# Altium schematic symbol library IC.SchLib: 555 symbols (part 2 of 15)
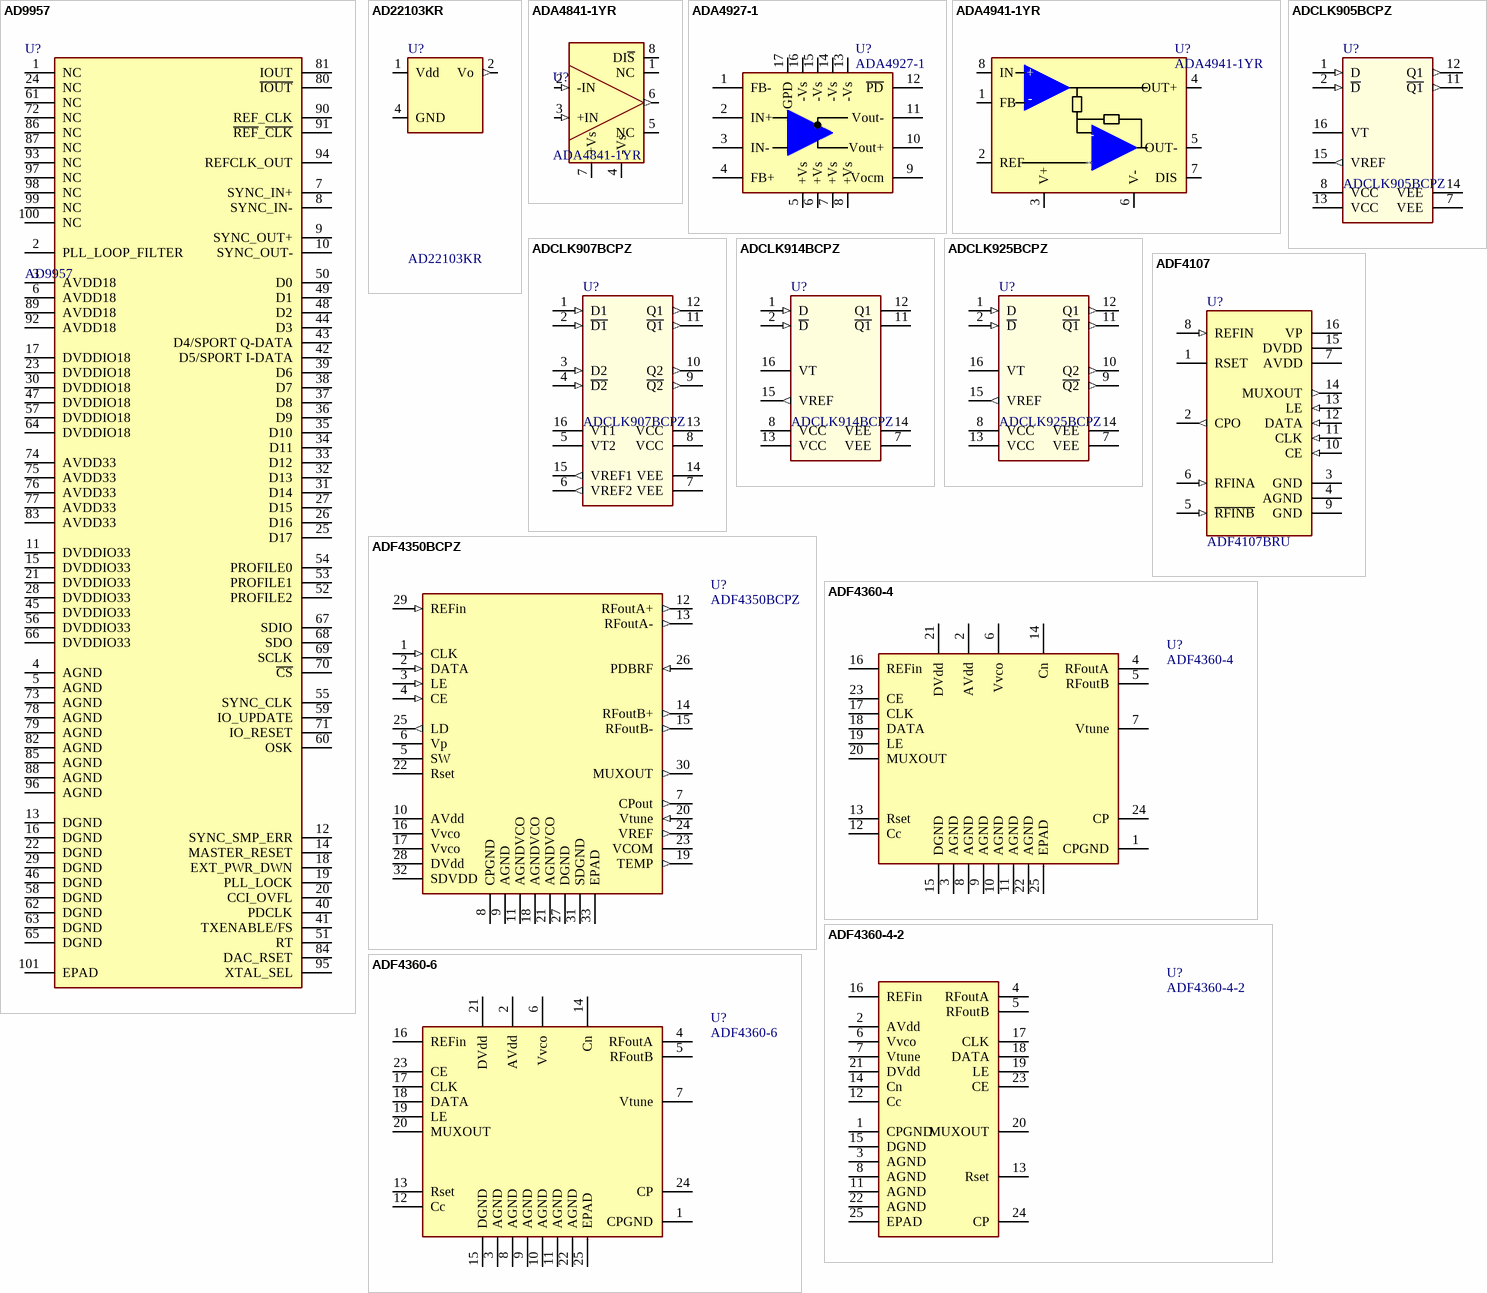
[diagram p71: symbols AD9957 to ADF4360-6]

## ADF4360-4
designator U?
Integrated Synthesizer and VCO; Manufacturer: Analog Devices; Manufacturer No: ADF4360-4BCPZ; Sort: 510; Tech: SMDR; Package: LFCSP24; Price: 0
footprint LFCSP24_EP (QFN, 24-Leads, Body 4,0x4,0mm (max), Pitch 0,50mm, IPC Medium Density)
pins: 1 CPGND, 2 AVdd, 3 AGND, 4 RFoutA, 5 RFoutB, 6 Vvco, 7 Vtune, 8 AGND, 9 AGND, 10 AGND, 11 AGND, 12 Cc, 13 Rset, 14 Cn, 15 DGND, 16 REFin, 17 CLK, 18 DATA, 19 LE, 20 MUXOUT, 21 DVdd, 22 AGND, 23 CE, 24 CP, 25 EPAD

## ADF4360-4-2
designator U?
Integrated Synthesizer and VCO; Manufacturer: Analog Devices; Manufacturer No: ADF4360-4BCPZ; Sort: 510; Tech: SMDR; Package: LFCSP24; Price: 0
footprint LFCSP24_EP (QFN, 24-Leads, Body 4,0x4,0mm (max), Pitch 0,50mm, IPC Medium Density)
pins: 1 CPGND, 2 AVdd, 3 AGND, 4 RFoutA, 5 RFoutB, 6 Vvco, 7 Vtune, 8 AGND, 11 AGND, 12 Cc, 13 Rset, 14 Cn, 15 DGND, 16 REFin, 17 CLK, 18 DATA, 19 LE, 20 MUXOUT, 21 DVdd, 22 AGND, 23 CE, 24 CP, 25 EPAD

## ADF4360-6
designator U?
Integrated Synthesizer and VCO; Manufacturer: Analog Devices; Manufacturer No: ADF4360-6BCPZ; Sort: 510; Tech: SMDR; Package: LFCSP24; Price: 0
footprint LFCSP24_EP (QFN, 24-Leads, Body 4,0x4,0mm (max), Pitch 0,50mm, IPC Medium Density)
pins: 1 CPGND, 2 AVdd, 3 AGND, 4 RFoutA, 5 RFoutB, 6 Vvco, 7 Vtune, 8 AGND, 9 AGND, 10 AGND, 11 AGND, 12 Cc, 13 Rset, 14 Cn, 15 DGND, 16 REFin, 17 CLK, 18 DATA, 19 LE, 20 MUXOUT, 21 DVdd, 22 AGND, 23 CE, 24 CP, 25 EPAD

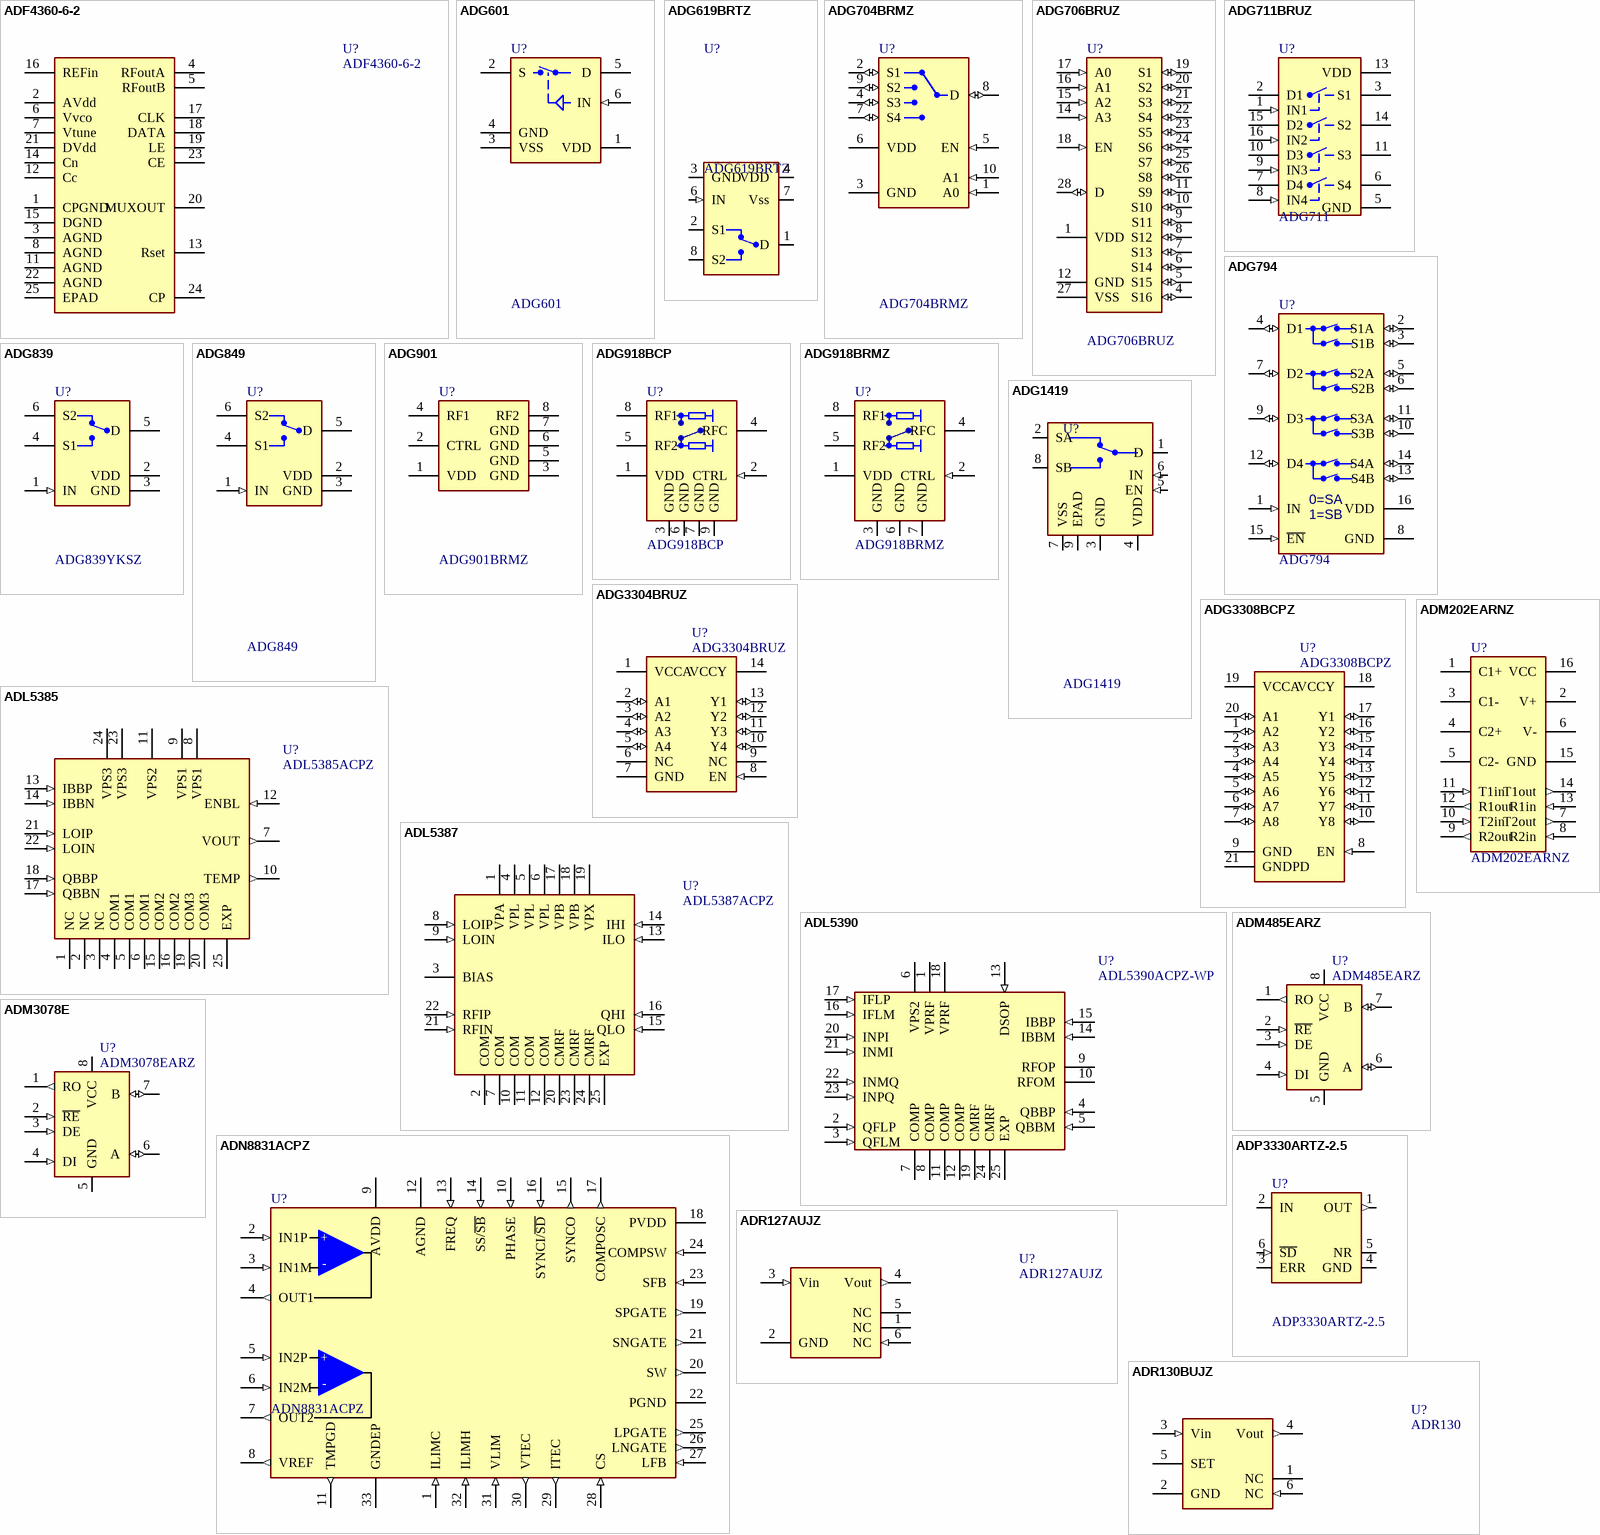
[diagram p6: symbols ADF4360-6-2 to ADR130BUJZ]

## ADF4360-6-2
designator U?
Integrated Synthesizer and VCO; Manufacturer: Analog Devices; Manufacturer No: ADF4360-6BCPZ; Sort: 510; Tech: SMDR; Package: LFCSP24; Price: 0
footprint LFCSP24_EP (QFN, 24-Leads, Body 4,0x4,0mm (max), Pitch 0,50mm, IPC Medium Density)
pins: 1 CPGND, 2 AVdd, 3 AGND, 4 RFoutA, 5 RFoutB, 6 Vvco, 7 Vtune, 8 AGND, 11 AGND, 12 Cc, 13 Rset, 14 Cn, 15 DGND, 16 REFin, 17 CLK, 18 DATA, 19 LE, 20 MUXOUT, 21 DVdd, 22 AGND, 23 CE, 24 CP, 25 EPAD

## ADG601
designator U?
2Ohm SPST Switch; Manufacturer: Analog Devices, Farnell; Manufacturer No: ADG601BRTZ-REEL7, 1661035; Comment2: +-5V/+5V; Sort: 510; Tech: SMDR; Package: SOT-23; Price: 0
footprint SOT23-6
pins: 1 VDD (power), 2 S, 3 VSS (power), 4 GND (power), 5 D, 6 IN (in)

## ADG619BRTZ
designator U?
4R, Single SPDT Switches; Manufacturer: Analog Devices; Comment2: ±2.7..±5.5Vcc 4Rsw (SCC); Sort: 510; Tech: SMDR; Manufacturer No: ADG619BRTZ; Package: SOIC8; Price: 0
signal-integrity model Model Name (Model Description)
footprint SOT23-8
pins: 1 D, 2 S1, 3 GND (power), 4 VDD (power), 6 IN (in), 7 Vss (power), 8 S2

## ADG704BRMZ
designator U?
Low Voltage 4:1 Mux Analog; Manufacturer: Analog Devices, Farnell; Manufacturer No: ADG704BRMZ, 9425756; Comment2: 1.8..5.5Vcc 2.5Ron; Sort: 510; Tech: SMDR; Package: MSOP10; Price: 2.5
footprint MSOP10-1 (MSOP 10pin 3x3mm R0.5mm)
pins: 1 A0 (in), 2 S1 (io), 3 GND (power), 4 S3 (io), 5 EN (in), 6 VDD (power), 7 S4 (io), 8 D (io), 9 S2 (io), 10 A1 (in)

## ADG706BRUZ
designator U?
16-channel analog multiplexer; Manufacturer: Analog, Farnell; Manufacturer No: ADG706BRUZ, 9604332; Comment2: 1.8..5.5Vcc 2.5Ronmax; Sort: 510; Tech: SMDR; Package: TSSOP28; Price: 5.4
footprint TSSOP28 (TSSOP, 28-Leads, Body 9,8x4,5mm (max), Pitch 0,65mm, IPC Medium Density)
pins: 1 VDD (power), 4 S16 (io), 5 S15 (io), 6 S14 (io), 7 S13 (io), 8 S12 (io), 9 S11 (io), 10 S10 (io), 11 S9 (io), 12 GND (power), 14 A3 (in), 15 A2 (in), 16 A1 (in), 17 A0 (in), 18 EN (in), 19 S1 (io), 20 S2 (io), 21 S3 (io), 22 S4 (io), 23 S5 (io), 24 S6 (io), 25 S7 (io), 26 S8 (io), 27 VSS (power), 28 D (io)

## ADG711BRUZ
designator U?, comment ADG711
Low Voltage 4 Quad SPST Switches; Manufacturer: Analog Devices; Manufacturer No: ADG711BRUZ; Comment2: 1.8 V to 5.5 V; 2.5 Ohm; Sort: 510; Tech: SMDR; Package: TSSOP-16; Price: 0
signal-integrity model Model Name (Model Description)
footprint TSSOP16 (TSSOP16 5x4.4mm R0.65mm)
pins: 1 IN1 (in), 2 D1, 3 S1, 5 GND (power), 6 S4, 7 D4, 8 IN4 (in), 9 IN3 (in), 10 D3, 11 S3, 13 VDD (power), 14 S2, 15 D2, 16 IN2 (in)

## ADG794
designator U?
Low Voltage, 300 MHz Quad 2:1 Mux Analog HDTV Audio/Video switch; Manufacturer: Analog Devices; Manufacturer No: ADG794BRQZ; Comment2: 3.3V;; Sort: 510; Tech: SMDR; Package: TSSOP16; Price: 0
footprint TSSOP16 (TSSOP16 5x4.4mm R0.65mm)
pins: 1 IN (in), 2 S1A (io), 3 S1B (io), 4 D1 (io), 5 S2A (io), 6 S2B (io), 7 D2 (io), 8 GND (power), 9 D3 (io), 10 S3B (io), 11 S3A (io), 12 D4 (io), 13 S4B (io), 14 S4A (io), 15 ~{EN} (in), 16 VDD (power)
text: 0=SA; 1=SB

## ADG839
designator U?, comment ADG839YKSZ
CMOS Single SPDT Switch/2:1 MUX; Manufacturer: Analog Devices; Comment2: 1.65 V to 3.6 V; 0.35R; Sort: 510; Tech: SMDR; Manufacturer No: ADG839YKSZ; Package: SC70-6; Price: 0
signal-integrity model Model Name (Model Description)
footprint SC70-6 (6-Leads, Body 2,0x2,1mm (max), Pitch 0,65mm, IPC Medium Density)
pins: 1 IN (in), 2 VDD (power), 3 GND (power), 4 S1, 5 D, 6 S2

## ADG849
designator U?
0.5Ohm SPDT/2:1 Mux; Manufacturer: Analog Devices; Manufacturer No: ADG849YKSZ-500RL7; Sort: 510; Tech: SMDR; Package: SC70-6; Price: 0
footprint SC70-6 (6-Leads, Body 2,0x2,1mm (max), Pitch 0,65mm, IPC Medium Density)
pins: 1 IN (in), 2 VDD (power), 3 GND (power), 4 S1, 5 D, 6 S2

## ADG901
designator U?, comment ADG901BRMZ
CMOS Wideband, 40dB isolation at 1GHz 1.65V to 2.75, SPST switch; Manufacturer: Analog Devices; Comment2: 1.65 V to 2.75 V; 50R; Sort: 510; Tech: SMDR; Manufacturer No: ADG901BRMZ; Package: TSSOP8; Price: 0
signal-integrity model Model Name (Model Description)
footprint TSSOP8 (TSSOP8 3x3mm R0.65mm)
pins: 1 VDD, 2 CTRL, 3 GND, 4 RF1, 5 GND, 6 GND, 7 GND, 8 RF2

## ADG918BCP
designator U?
SPDT High Power CMOS RF Switch 4GHz; Manufacturer: Analog Devices; Comment2: 1.65-2.75Vcc, 1uA; Sort: 510; Tech: SMDR; Manufacturer No: ADG918BCP; Package: LFCSP8; Price: 0
footprint LFCSP8-1
pins: 1 VDD (power), 2 CTRL (in), 3 GND (power), 4 RFC (hiz), 5 RF2 (hiz), 6 GND (power), 7 GND (power), 8 RF1 (hiz), 9 GND (power)

## ADG918BRMZ
designator U?
SPDT High Power CMOS RF Switch; SO8; Manufacturer: Analog Devices; Sort: 510; Tech: SMDR; Manufacturer No: ADG918BRMZ; Package: MSOP08; Price: 0
footprint TSSOP8 (TSSOP8 3x3mm R0.65mm)
pins: 1 VDD (power), 2 CTRL (in), 3 GND (power), 4 RFC (hiz), 5 RF2 (hiz), 6 GND (power), 7 GND (power), 8 RF1 (hiz)

## ADG1419
designator U?
2.1R On Resistance, ±15 V/+12 V/±5 V  iCMOS SPDT Switch; Manufacturer: Analog Devices, Digi-Key; Manufacturer No: ADG1419BCPZ-REEL7, ADG1419BCPZ-REEL7CT-ND; Sort: 510; Tech: SMDR; Package: LFCSP8; Price: 0
footprint LFCSP8-2 (QFN, 8-Leads, Body 3,0x2,0mm (max), Pitch 0,50mm, IPC Medium Density)
pins: 1 D, 2 SA, 3 GND (power), 4 VDD (power), 5 EN (in), 6 IN (in), 7 VSS (power), 8 SB, 9 EPAD (power)
1 alternate drawing of the same symbol

## ADG3304BRUZ
designator U?
Low Voltage, 1.15 V to 5.5 V, 4-Channel,  Bidirectional Logic Level Translator; Manufacturer: Analog Devices, Farnell; Manufacturer No: ADG3304BRUZ, 1078228; Comment2: 1.15-5.5V; Sort: 510; Tech: SMDR; Package: TSSOP14; Price: 3.2
footprint TSSOP14 (TSSOP14 5x4.4mm R0.65mm)
pins: 1 VCCA (power), 2 A1 (io), 3 A2 (io), 4 A3 (io), 5 A4 (io), 6 NC, 7 GND (power), 8 EN (in), 9 NC, 10 Y4 (io), 11 Y3 (io), 12 Y2 (io), 13 Y1 (io), 14 VCCY (power)

## ADG3308BCPZ
designator U?
Low Voltage, 1.15 V to 5.5 V, 8-Channel,  Bidirectional Logic Level Translator; Manufacturer: Analog Devices, Digi-Key; Manufacturer No: ADG3308BCPZ, ADG3308BCPZ-REEL7; Comment2: 1.15-5.5V; Sort: 510; Tech: SMDR; Package: TSSOP14; Price: 3.2
footprint QFN50P400X400X100-20N (QFN, 20-Leads, Body 4,0x4,0mm (max), Pitch 0,50mm, IPC Medium Density)
pins: 1 A2 (io), 2 A3 (io), 3 A4 (io), 4 A5 (io), 5 A6 (io), 6 A7 (io), 7 A8 (io), 8 EN (in), 9 GND (power), 10 Y8 (io), 11 Y7 (io), 12 Y6 (io), 13 Y5 (io), 14 Y4 (io), 15 Y3 (io), 16 Y2 (io), 17 Y1 (io), 18 VCCY (power), 19 VCCA (power), 20 A1 (io), 21 GNDPD

## ADL5385
designator U?, comment ADL5385ACPZ
Quadrature modulator 50 TO 2200MHz; Manufacturer: Analog Devices; Sort: 510; Tech: SMDR; Manufacturer No: ADL5385ACPZ; Package: CP-24-2; Price: 0
footprint CP-24-2 (24pin LFCSP_VQ Waffle pack)
pins: 1 NC, 2 NC, 3 NC, 4 COM1 (power), 5 COM1 (power), 6 COM1 (power), 7 VOUT (out), 8 VPS1 (power), 9 VPS1 (power), 10 TEMP (out), 11 VPS2 (power), 12 ENBL (in), 13 IBBP (in), 14 IBBN (in), 15 COM2 (power), 16 COM2 (power), 17 QBBN (in), 18 QBBP (in), 19 COM3 (power), 20 COM3 (power), 21 LOIP (in), 22 LOIN (in), 23 VPS3 (power), 24 VPS3 (power), 25 EXP (power)

## ADL5387
designator U?, comment ADL5387ACPZ
Quadrature demodulator 50MHz to 2GHz; Manufacturer: Analog Devices; Sort: 510; Tech: SMDR; Manufacturer No: ADL5387ACPZ; Package: CP-24-2; Price: 0
footprint CP-24-2 (24pin LFCSP_VQ Waffle pack)
pins: 1 VPA (power), 2 COM (power), 3 BIAS, 4 VPL (power), 5 VPL (power), 6 VPL (power), 7 COM (power), 8 LOIP (in), 9 LOIN (in), 10 COM (power), 11 COM (power), 12 COM (power), 13 ILO (in), 14 IHI (in), 15 QLO (in), 16 QHI (in), 17 VPB (power), 18 VPB (power), 19 VPX (power), 20 CMRF (power), 21 RFIN (in), 22 RFIP (in), 23 CMRF (power), 24 CMRF (power), 25 EXP (power)

## ADL5390
designator U?, comment ADL5390ACPZ-WP
RF / IF Vector Multiplier 20 TO 2400MHz; Manufacturer: Analog Devices; Sort: 510; Tech: SMDR; Manufacturer No: ADL5390ACPZ-WP; Package: CP-24-2; Price: 0
footprint CP-24-2 (24pin LFCSP_VQ Waffle pack)
pins: 1 VPRF (power), 2 QFLP (in), 3 QFLM (in), 4 QBBP (in), 5 QBBM (in), 6 VPS2 (power), 7 COMP (power), 8 COMP (power), 9 RFOP (power), 10 RFOM (power), 11 COMP (power), 12 COMP (power), 13 DSOP (in), 14 IBBM (in), 15 IBBP (in), 16 IFLM (in), 17 IFLP (in), 18 VPRF (power), 19 CMRF (power), 20 INPI (in), 21 INMI (in), 22 INMQ (in), 23 INPQ (in), 24 CMRF (power), 25 EXP (power)

## ADM202EARNZ
designator U?
Dual RS232 transciever +5V; Manufacturer: Analog Devices, Farnell; Manufacturer No: ADM202EARNZ, 1333249; Sort: 510; Tech: SMDR; Package: SOIC16; Price: 0
footprint SOIC16-1 (Small IC 16 pin)
pins: 1 C1+, 2 V+, 3 C1-, 4 C2+, 5 C2-, 6 V-, 7 T2out (out), 8 R2in (in), 9 R2out (out), 10 T2in (in), 11 T1in (in), 12 R1out (out), 13 R1in (in), 14 T1out (out), 15 GND (power), 16 VCC (power)

## ADM485EARZ
designator U?
RS485 Half Dupl. transceiver 5V, 2.5Mbps; Manufacturer: Analog Devices, Farnell; Manufacturer No: ADM485EARZ, 1439034; Sort: 510; Tech: SMDR; Package: SOIC8; Price: 1.4
footprint SOIC8-1
pins: 1 RO (out), 2 ~{RE} (in), 3 DE (in), 4 DI (in), 5 GND (power), 6 A (io), 7 B (io), 8 VCC (power)

## ADM3078E
designator U?, comment ADM3078EARZ
RS485 Half Dupl. transceiver 3V3, 16Mbps; Manufacturer: Analog Devices, Farnell; Manufacturer No: ADM3078EARZ, 1439025; Sort: 510; Tech: SMDR; Package: SOIC8; Price: 3
footprint SOIC8-1
pins: 1 RO (out), 2 ~{RE} (in), 3 DE (in), 4 DI (in), 5 GND (power), 6 A (io), 7 B (io), 8 VCC (power)

## ADN8831ACPZ
designator U?
Thermoelectric Cooler Controller; Manufacturer: Analog Devices, Digikey; Manufacturer No: ADN8831ACPZ, ADN8831ACPZ-REEL7CT-ND; Comment2: 3..5.5Vcc 1MHzsw; Sort: 510; Tech: SMDR; Package: LFCSP32; Price: 14
footprint LFCSP32_EP (QFN, 32-Leads, Body 5,0x5,0mm (max), Pitch 0,50mm, IPC Medium Density)
pins: 1 ILIMC (in), 2 IN1P (in), 3 IN1M (in), 4 OUT1 (out), 5 IN2P (in), 6 IN2M (in), 7 OUT2 (out), 8 VREF (out), 9 AVDD (power), 10 PHASE (in), 11 TMPGD (out), 12 AGND (power), 13 FREQ (in), 14 SS/~{SB} (in), 15 SYNCO (out), 16 SYNCI/~{SD} (in), 17 COMPOSC (out), 18 PVDD (power), 19 SPGATE (out), 20 SW (out), 21 SNGATE (out), 22 PGND (power), 23 SFB (in), 24 COMPSW (in), 25 LPGATE (out), 26 LNGATE (out), 27 LFB (in), 28 CS (in), 29 ITEC (out), 30 VTEC (out), 31 VLIM (in), 32 ILIMH (in), 33 GNDEP (power)
text: +; -

## ADP3330ARTZ-2.5
designator U?
2.5V 0.2A Low drop regulator SOT23-6; Manufacturer: Analog, Digikey; Manufacturer No: ADP3330ARTZ-2.5, ADP3330ARTZ-2.5-R7CT-ND; Comment2: 2.9..12Vin 2.5Vout 0.2A 0.14Vdrop; Sort: 520; Tech: SMDR; Package: SOT23-6; Price: 1,6
footprint SOT23-6
pins: 1 OUT (out), 2 IN (power), 3 ERR (oc), 4 GND (power), 5 NR, 6 ~{SD} (in)

## ADR127AUJZ
designator U?
Precision, Micropower LDO Voltage; Manufacturer: Analog Devices; Comment2: 1.25V 0.24% 25ppm; Sort: 510; Tech: SMDR; Manufacturer No: ADR127AUJZ; Package: SOT23-6; Price: 0
footprint SOT23-6
pins: 1 NC, 2 GND (power), 3 Vin (in), 4 Vout (out), 5 NC, 6 NC (in)

## ADR130BUJZ
designator U?, comment ADR130
Precision Series Sub-Band Gap Voltage Reference; Manufacturer: Analog Devices; Manufacturer No: ADR130BUJZ-R2; Sort: 510; Tech: SMDR; Package: SOT23-6; Price: 0
footprint SOT23-6
pins: 1 NC, 2 GND (power), 3 Vin (in), 4 Vout (out), 5 SET, 6 NC (in)

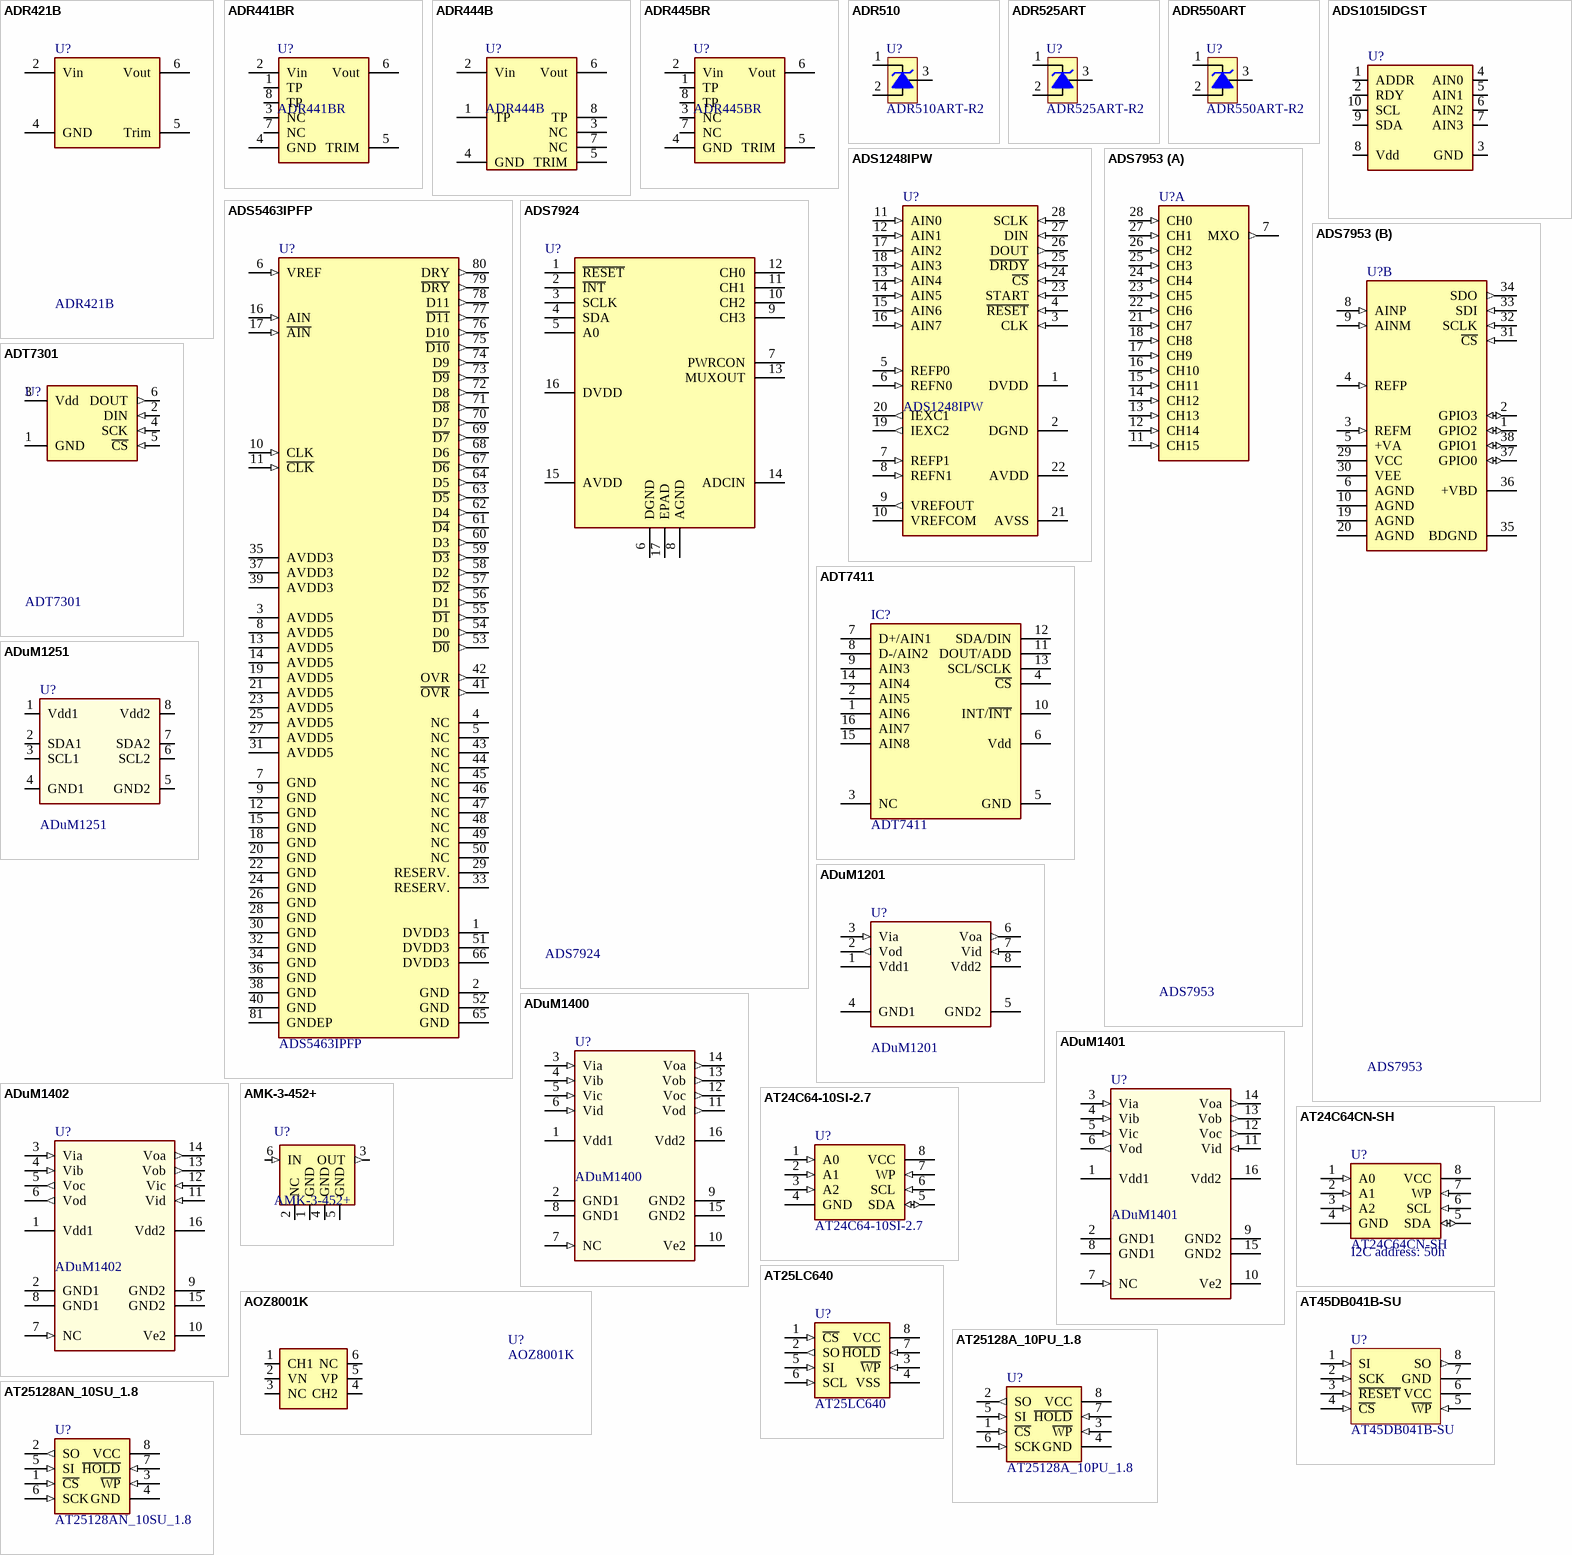
[diagram p7: symbols ADR421B to AT25128AN_10SU_1.8]

## ADR421B
designator U?
2.5V precision reference; Manufacturer: Linear Technologies, Farnell; Manufacturer No: ADR421BRZ, 1311295; Comment2: 4.5-18Vin; 2.5Vout 3ppm 0.05%; Sort: 510; Tech: SMDR; Package: SOIC8; Price: 0
footprint SOIC8-1
pins: 2 Vin (power), 4 GND (power), 5 Trim, 6 Vout (power)

## ADR441BR
designator U?
Ultralow Noise, LDO XFET Voltage Reference with Current Sink and Source; Manufacturer: Analog, Farnell; Manufacturer No: ADR441BRZ, 1274158; Comment2: 2.500V 5.5..18Vcc 0.04% 3ppm/C; Sort: 520; Tech: SMDR; Package: SOIC8; Price: 6.2
footprint SOIC8-1
pins: 1 TP, 2 Vin (power), 3 NC, 4 GND (power), 5 TRIM, 6 Vout (power), 7 NC, 8 TP

## ADR444B
designator U?
Ultralow Noise, LDO XFET Voltage Reference with Current Sink and Source; Manufacturer: Analog Devices; Manufacturer No: ADR444BRZ; Comment2: 4.096V, 1.6Vacc, 3ppm/C; Sort: 510; Tech: SMDR; Package: SOIC; Price: 0
footprint SOIC8-1
pins: 1 TP, 2 Vin (power), 3 NC, 4 GND (power), 5 TRIM, 6 Vout (power), 7 NC, 8 TP

## ADR445BR
designator U?
Ultralow Noise, LDO XFET Voltage Reference with Current Sink and Source; Manufacturer: Analog, Farnell; Manufacturer No: ADR445BRZ, 1274148; Comment2: 5.000V 5.5..18Vcc 0.04% 3ppm/C; Sort: 520; Tech: SMDR; Package: SOIC8; Price: 7,2
footprint SOIC8-1
pins: 1 TP, 2 Vin (power), 3 NC, 4 GND (power), 5 TRIM, 6 Vout (power), 7 NC, 8 TP

## ADR510
designator U?, comment ADR510ART-R2
Voltage reference; low noise 1.0V; Manufacturer: Analog Devices; Comment2: 5V 0.4%; Sort: 510; Tech: SMDR; Package: SOT23; Manufacturer No: ADR510ART-R2; Price: 0
footprint SOT23-1
pins: 1 C, 2 A, 3 REF

## ADR525ART
designator U?, comment ADR525ART-R2
Voltage reference; low noise; Manufacturer: Analog Devices; Comment2: 2.5V 0.4%; Sort: 510; Tech: SMDR; Package: SOT23; Manufacturer No: ADR525ART-R2; Price: 0
footprint SOT23-1
pins: 1 C, 2 A, 3 REF

## ADR550ART
designator U?, comment ADR550ART-R2
Voltage reference; low noise; Manufacturer: Analog Devices; Comment2: 5V 0.4%; Sort: 510; Tech: SMDR; Package: SOT23; Manufacturer No: ADR550ART-R2; Price: 0
footprint SOT23-1
pins: 1 C, 2 A, 3 REF

## ADS1015IDGST
designator U?
ADC 12bit 3.3ksps; Manufacturer: Texas Instruments; Sort: 510; Tech: SMDR; Manufacturer No: ADS1015IDGST; Comment2: 12bit 3.3ksps; Package: TQFP80; Price: 3.42; Supplier: Digi-Key; Supplier No: 296-25227-1-ND
footprint TSSOP50P490X110-10N (uMAX10; TSSOP, 10-Leads, Body 3,0x3,0mm (max), Pitch 0,50mm, IPC Medium Density)
signal-integrity model Model Name (Model Description)
pins: 1 ADDR, 2 RDY, 3 GND, 4 AIN0, 5 AIN1, 6 AIN2, 7 AIN3, 8 Vdd, 9 SDA, 10 SCL

## ADS1248IPW
designator U?
24-Bit Sigma Delta ADC with Excitation Current Sources; Manufacturer: Texas, Farnell; Manufacturer No: ADS1248IPW, 1735557; Comment2: 2.7..5.5V 2kSPS; Sort: 510; Tech: SMDR; Package: TSSOP28; Price: 11.6
signal-integrity model Model Name (Model Description)
footprint TSSOP28 (TSSOP, 28-Leads, Body 9,8x4,5mm (max), Pitch 0,65mm, IPC Medium Density)
pins: 1 DVDD (power), 2 DGND (power), 3 CLK (in), 4 ~{RESET} (in), 5 REFP0 (in), 6 REFN0 (in), 7 REFP1 (in), 8 REFN1 (in), 9 VREFOUT (out), 10 VREFCOM, 11 AIN0 (in), 12 AIN1 (in), 13 AIN4 (in), 14 AIN5 (in), 15 AIN6 (in), 16 AIN7 (in), 17 AIN2 (in), 18 AIN3 (in), 19 IEXC2 (out), 20 IEXC1 (out), 21 AVSS (power), 22 AVDD (power), 23 START (in), 24 ~{CS} (in), 25 ~{DRDY} (in), 26 DOUT (out), 27 DIN (in), 28 SCLK (in)

## ADS5463IPFP
designator U?
ADC 12bit 500MHz; Manufacturer: Texas; Sort: 510; Tech: SMDR; Manufacturer No: ADS5463IPFP; Package: TQFP80; Price: 200
footprint TSSOP50P490X110-10N (uMAX10; TSSOP, 10-Leads, Body 3,0x3,0mm (max), Pitch 0,50mm, IPC Medium Density)
signal-integrity model Model Name (Model Description)
pins: 1 DVDD3 (power), 2 GND (power), 3 AVDD5 (power), 4 NC, 5 NC, 6 VREF (in), 7 GND (power), 8 AVDD5 (power), 9 GND (power), 10 CLK (in), 11 ~{CLK} (in), 12 GND (power), 13 AVDD5 (power), 14 AVDD5 (power), 15 GND (power), 16 AIN (in), 17 ~{AIN} (in), 18 GND (power), 19 AVDD5 (power), 20 GND (power), 21 AVDD5 (power), 22 GND (power), 23 AVDD5 (power), 24 GND (power), 25 AVDD5 (power), 26 GND (power), 27 AVDD5 (power), 28 GND (power), 29 RESERV., 30 GND (power), 31 AVDD5 (power), 32 GND (power), 33 RESERV., 34 GND (power), 35 AVDD3 (power), 36 GND (power), 37 AVDD3 (power), 38 GND (power), 39 AVDD3 (power), 40 GND (power), 41 ~{OVR} (out), 42 OVR (out), 43 NC, 44 NC, 45 NC, 46 NC, 47 NC, 48 NC, 49 NC, 50 NC, 51 DVDD3 (power), 52 GND (power), 53 ~{D0} (out), 54 D0 (out), 55 ~{D1} (out), 56 D1 (out), 57 ~{D2} (out), 58 D2 (out), 59 ~{D3} (out), 60 D3 (out), 61 ~{D4} (out), 62 D4 (out), 63 ~{D5} (out), 64 D5 (out), 65 GND (power), 66 DVDD3 (power), 67 ~{D6} (out), 68 D6 (out), 69 ~{D7} (out), 70 D7 (out), 71 ~{D8} (out), 72 D8 (out), 73 ~{D9} (out), 74 D9 (out), 75 ~{D10} (out), 76 D10 (out), 77 ~{D11} (out), 78 D11 (out), 79 ~{DRY} (out), 80 DRY (out), 81 GNDEP (power)

## ADS7924
designator U?
2.2V, 12-Bit, 4-Channel, microPOWER™  ANALOG-TO-DIGITAL CONVERTER WITH I2C INTERFACE; Manufacturer: Texas Instruments, Farnell; Manufacturer No: ADS7924IRTET, 1829663; Comment2: +5Vcc 12bit 100KSps; Sort: 510; Tech: SMDR; Package: QFN16; Price: 0
footprint QFN16N-2 (QFN, 16-Leads, Body 3,0x3,0mm (max), Pitch 0,50mm, IPC Medium Density)
signal-integrity model Model Name (Model Description)
pins: 1 ~{RESET}, 2 ~{INT}, 3 SCLK, 4 SDA, 5 A0, 6 DGND, 7 PWRCON, 8 AGND, 9 CH3, 10 CH2, 11 CH1, 12 CH0, 13 MUXOUT, 14 ADCIN, 15 AVDD, 16 DVDD, 17 EPAD

## ADS7953
designator U?
ADC 12bit 1MSps 16ch mux SPI bus; Manufacturer: Texas, Farnell; Manufacturer No: ADS7953SBDBT, 1645402; Comment2: 2.7-5.5Vcc; Sort: 510; Tech: SMDR; Package: TSSOP38; Price: 10
footprint TSSOP50P640X120-38N (TSSOP, 38-Leads, Body 9,8x4,5mm (max), Pitch 0,50mm, IPC Medium Density)
signal-integrity model Model Name (Model Description)
part A pins: 7 MXO (out), 11 CH15 (in), 12 CH14 (in), 13 CH13 (in), 14 CH12 (in), 15 CH11 (in), 16 CH10 (in), 17 CH9 (in), 18 CH8 (in), 21 CH7 (in), 22 CH6 (in), 23 CH5 (in), 24 CH4 (in), 25 CH3 (in), 26 CH2 (in), 27 CH1 (in), 28 CH0 (in)
part B pins: 1 GPIO2 (io), 2 GPIO3 (io), 3 REFM (in), 4 REFP (in), 5 +VA (power), 6 AGND (power), 8 AINP (in), 9 AINM (in), 10 AGND (power), 19 AGND (power), 20 AGND (power), 29 VCC (power), 30 VEE (power), 31 ~{CS} (in), 32 SCLK (in), 33 SDI (in), 34 SDO (out), 35 BDGND (power), 36 +VBD (power), 37 GPIO0 (io), 38 GPIO1 (io)

## ADT7301
designator U?
SPI 13-bit digital temperature sensor; Manufacturer: Analog Devices, Farnell; Manufacturer No: ADT7301ARTZ-500RL7, 1838912; Comment2: 2.7~5.25Vcc, -40t~150degC, +-0.5degC 0.03125degCresol; Sort: 510; Tech: SMDR; Package: SOT23-6; Price: 3.6
footprint SOT23-6
pins: 1 GND (power), 2 DIN (in), 3 Vdd (power), 4 SCK (in), 5 ~{CS} (in), 6 DOUT (out)

## ADT7411
designator IC?
SPI/I2C Compatible, 10-bit digital temperature sensor and 8-channel ADC; Manufacturer: Analog Devices; Manufacturer No: ADT7411ARQ; Sort: 510; Tech: SMDR; Package: QSOP16; Price: 0
footprint QSOP16 (SSOP; 16 Leads; Body Width 3.9 mm; Pitch 0.635 mm)
pins: 1 AIN6, 2 AIN5, 3 NC, 4 ~{CS}, 5 GND, 6 Vdd, 7 D+/AIN1, 8 D-/AIN2, 9 AIN3, 10 INT/~{INT}, 11 DOUT/ADD, 12 SDA/DIN, 13 SCL/SCLK, 14 AIN4, 15 AIN8, 16 AIN7

## ADuM1201
designator U?
Dual-Channel Digital Isolator, iCoupler, 1/1; Manufacturer: Analog Devices; Manufacturer No: ADuM1201CRZ; Comment2: 3V/5V, 2.5kV, dc - 25Mbps; Sort: 510; Tech: SMDR; Package: SOIC8; Price: 0
footprint SOIC8-1
signal-integrity model Model Name (Model Description)
pins: 1 Vdd1 (power), 2 Vod (out), 3 Via (in), 4 GND1 (power), 5 GND2 (power), 6 Voa (out), 7 Vid (in), 8 Vdd2 (power)

## ADuM1251
designator U?
Hot swappable, Dual I2C Isolator; Manufacturer: Analog Devices. Farnell, Digi-Key; Manufacturer No: ADUM1251ARZ, 1439002, ADUM1251ARZ-ND; Comment2: 3V/5.5V, 2.5kV, dc - 1Mbps; Sort: 510; Tech: SMDR; Package: SOIC8; Price: 0
footprint SOIC8-1
signal-integrity model Model Name (Model Description)
pins: 1 Vdd1 (power), 2 SDA1, 3 SCL1, 4 GND1 (power), 5 GND2 (power), 6 SCL2, 7 SDA2, 8 Vdd2 (power)

## ADuM1400
designator U?
Quad-Channel Digital Isolator, iCoupler, 4/0; Manufacturer: Analog Devices; Manufacturer No: ADuM1400CRWZ; Comment2: 3V/5V, 2.5kV, dc - 90Mbps; Sort: 510; Tech: SMDR; Package: SOIC16W; Price: 0
footprint SOIC16WN (SOIC, 16-Leads, Body 10,4x7,5mm (max), Pitch 1,27mm, IPC Medium Density)
signal-integrity model Model Name (Model Description)
pins: 1 Vdd1 (power), 2 GND1 (power), 3 Via (in), 4 Vib (in), 5 Vic (in), 6 Vid (in), 7 NC (in), 8 GND1 (power), 9 GND2 (power), 10 Ve2, 11 Vod (out), 12 Voc (out), 13 Vob (out), 14 Voa (out), 15 GND2 (power), 16 Vdd2 (power)

## ADuM1401
designator U?
Quad-Channel Digital Isolator, iCoupler, 3/1; Manufacturer: Analog Devices; Manufacturer No: ADuM1401CRWZ; Comment2: 3V/5V, 2.5kV, dc - 90Mbps; Sort: 510; Tech: SMDR; Package: SOIC16W; Price: 0
footprint SOIC16WN (SOIC, 16-Leads, Body 10,4x7,5mm (max), Pitch 1,27mm, IPC Medium Density)
signal-integrity model Model Name (Model Description)
pins: 1 Vdd1 (power), 2 GND1 (power), 3 Via (in), 4 Vib (in), 5 Vic (in), 6 Vod (out), 7 NC (in), 8 GND1 (power), 9 GND2 (power), 10 Ve2, 11 Vid (in), 12 Voc (out), 13 Vob (out), 14 Voa (out), 15 GND2 (power), 16 Vdd2 (power)

## ADuM1402
designator U?
Quad-Channel Digital Isolator, iCoupler, 2/2; Manufacturer: Analog Devices; Manufacturer No: ADuM1402CRWZ; Comment2: 3V/5V, 2.5kV, dc - 90Mbps; Sort: 510; Tech: SMDR; Package: SOIC16W; Price: 0
footprint SOIC16WN (SOIC, 16-Leads, Body 10,4x7,5mm (max), Pitch 1,27mm, IPC Medium Density)
signal-integrity model Model Name (Model Description)
pins: 1 Vdd1 (power), 2 GND1 (power), 3 Via (in), 4 Vib (in), 5 Voc (out), 6 Vod (out), 7 NC (in), 8 GND1 (power), 9 GND2 (power), 10 Ve2, 11 Vid (in), 12 Vic (in), 13 Vob (out), 14 Voa (out), 15 GND2 (power), 16 Vdd2 (power)

## AMK-3-452+
designator U?
X3 Frequency Multiplier; Manufacturer: MiniCircuits; Comment2: FROM 3000 TO 4500MHz  50R; Sort: 330; Tech: SMDR; Manufacturer No: AMK-3-452+; Package: CD636; Price: 0
footprint CD636 (X3 Frequency Multiplier 6 pin R2.54mm)
pins: 1 GND (power), 2 NC (power), 3 OUT (out), 4 GND (power), 5 GND (power), 6 IN (in)

## AOZ8001K
designator U?
Ultra-Low Capacitance TVS Diode Array; Manufacturer: Alpha & Omega; Manufacturer No: AOZ8001KI; Sort: 510; Tech: SMDR; Package: SC-89; Price: 0
footprint SC-89 (SC-89 6pins, 0.5mm pitch)
pins: 1 CH1, 2 VN, 3 NC, 4 CH2, 5 VP, 6 NC

## AT24C64-10SI-2.7
designator U?
EEPROM 8kbit I2C 2.7-5.5V SOIC8; Manufacturer: Atmel; Sort: 510; Tech: SMDR; Manufacturer No: AT24C64-10SI-2.7; Package: SOIC8W1; Price: 0
signal-integrity model Model Name (Model Description)
footprint SOIC8W1 (SOIC 8 pin 5.3mm wide)
pins: 1 A0 (in), 2 A1 (in), 3 A2 (in), 4 GND (power), 5 SDA (io), 6 SCL (in), 7 WP (in), 8 VCC (power)

## AT24C64CN-SH
designator U?  I2C address: 50h
EEPROM 8kbyte I2C 1.8-3.6V SOIC8; Manufacturer: Atmel, Farnell; Manufacturer No: AT24C64CN-SH-B, 1362658; Comment2: 1.8..3.6Vcc I2C 64kbit; Sort: 510; Tech: SMDR; Package: SOIC8; Price: 0.75
signal-integrity model Model Name (Model Description)
footprint SOIC8-1
pins: 1 A0 (in), 2 A1 (in), 3 A2 (in), 4 GND (power), 5 SDA (io), 6 SCL (in), 7 WP (in), 8 VCC (power)

## AT25LC640
designator U?
EEPROM 8kbit SPI 2.5-5.5V; Manufacturer: Microchip; Manufacturer No: AT25LC640I/SN; Sort: 510; Tech: SMDR; Package: SOIC8; Price: 0
signal-integrity model Model Name (Model Description)
footprint SOIC8-1
pins: 1 ~{CS} (in), 2 SO (out), 3 ~{WP} (in), 4 VSS (power), 5 SI (in), 6 SCL (in), 7 ~{HOLD} (in), 8 VCC (power)

## AT45DB041B-SU
designator U?
Serial Flash 4Mbit SPI 2.7-3.6V SOIC8; Manufacturer: Atmel; Sort: 510; Tech: SMDR; Manufacturer No: AT45DB041B-SU; Package: SOIC8W; Price: 0
signal-integrity model Model Name (Model Description)
footprint SOIC8W1 (SOIC 8 pin 5.3mm wide)
pins: 1 SI (in), 2 SCK (in), 3 ~{RESET} (in), 4 ~{CS} (in), 5 ~{WP} (in), 6 VCC (power), 7 GND (power), 8 SO (out)

## AT25128A_10PU_1.8
designator U?
EEPROM PDIL 128kbit SPI 1.8-5.5V; Manufacturer: Atmel; Sort: 510; Tech: SMDR; Manufacturer No: AT25128A_10PU_1.8; Package: PDIL8; Price: 0
signal-integrity model Model Name (Model Description)
footprint PDIL8 (DIP; 8 Leads; Row Spacing 7.62 mm; Pitch 2.54 mm)
pins: 1 ~{CS} (in), 2 SO (out), 3 ~{WP} (in), 4 GND (power), 5 SI (in), 6 SCK (in), 7 ~{HOLD} (in), 8 VCC (power)

## AT25128AN_10SU_1.8
designator U?
EEPROM 128kbit SPI 1.8-5.5V; Manufacturer: Atmel; Sort: 510; Tech: SMDR; Manufacturer No: AT25128AN_10SU_1.8; Package: SOIC8; Price: 0
signal-integrity model Model Name (Model Description)
footprint SOIC8-1
pins: 1 ~{CS} (in), 2 SO (out), 3 ~{WP} (in), 4 GND (power), 5 SI (in), 6 SCK (in), 7 ~{HOLD} (in), 8 VCC (power)
